# Altium footprint library TinyShuffle v.0.PcbLib: 31 footprints (part 1 of 2)
Each footprint in its own frame and in the unit in brackets; x right, y up, seen from the top. Pads: shape width x height; smd on the part's side, far side on the other; paste and mask are expansions set on the pad; w line width, h text height; cw(c..) or ccw(c..) is an arc to the next point about the centre after c.
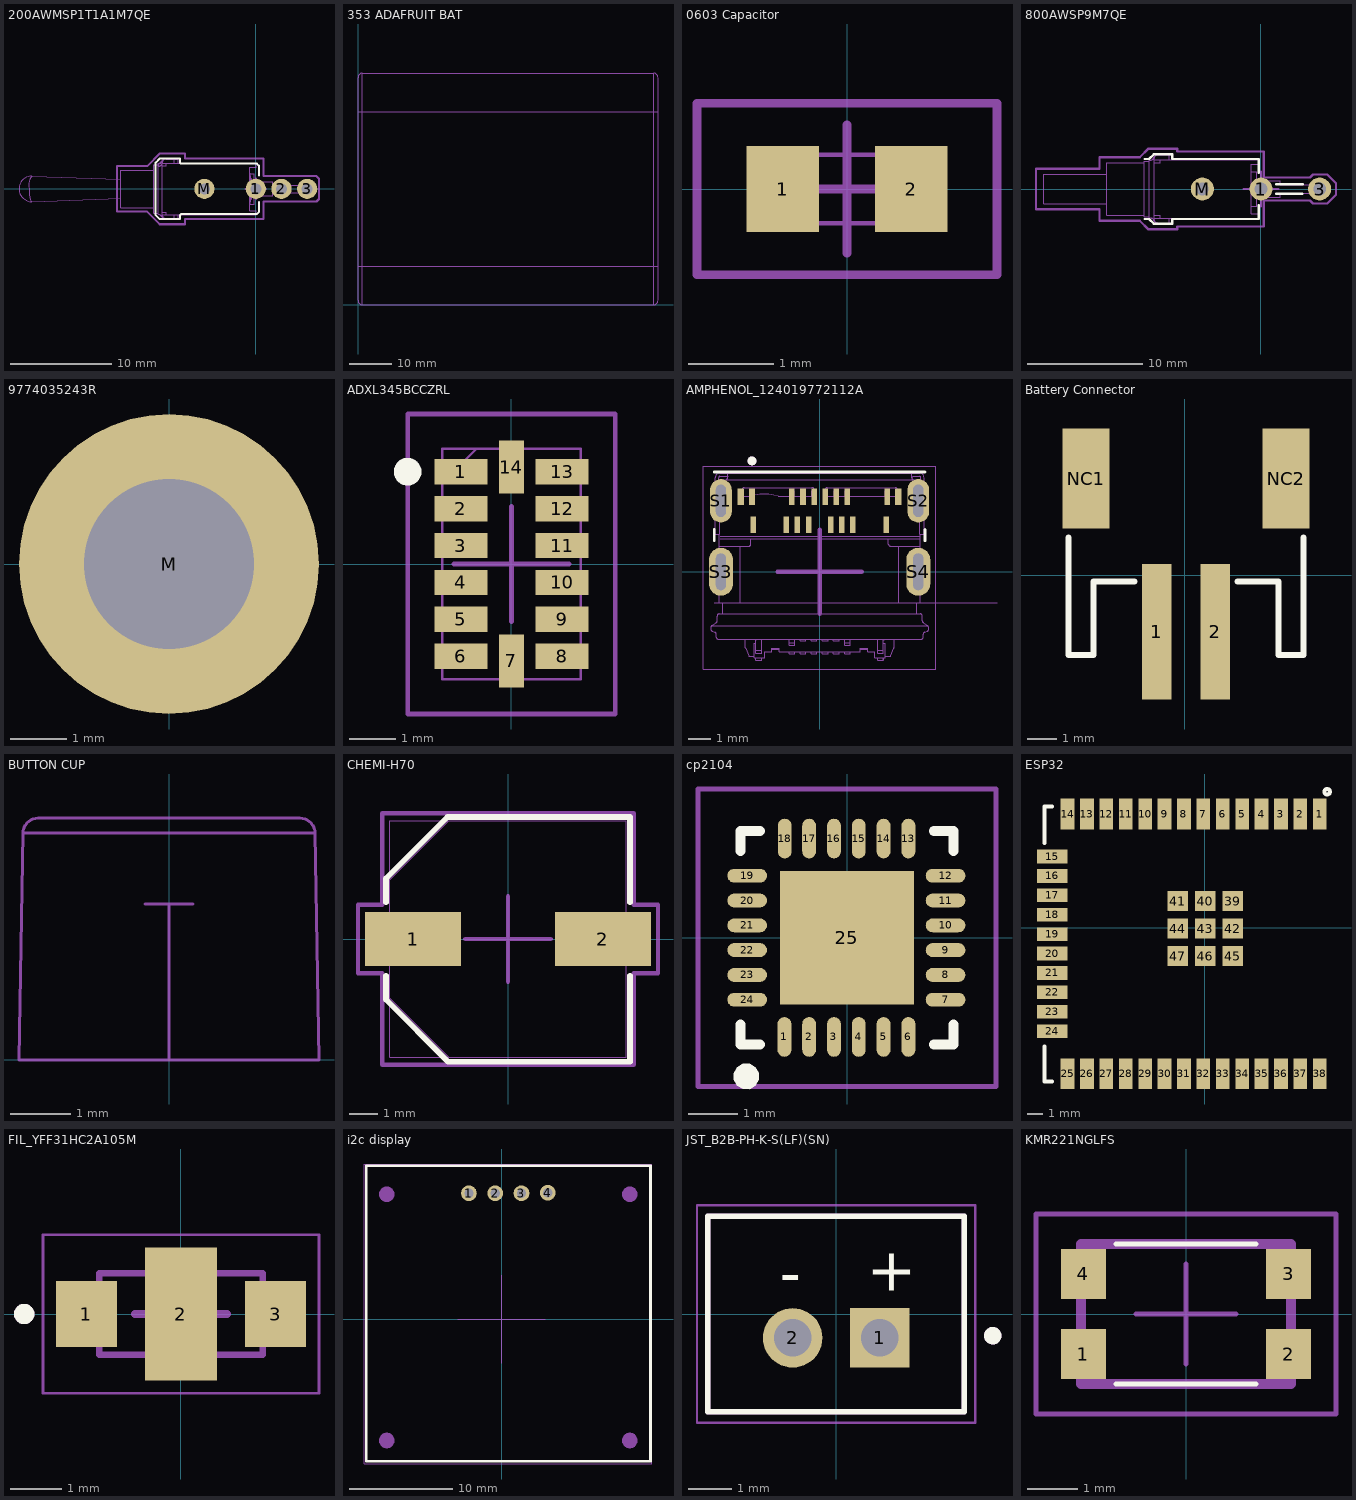
[diagram p0: the footprints below, top view; thin cyan lines are the x and y axes]

## 200AWMSP1T1A1M7QE [mm] "SWITCH TOGGLE SPDT 3A 120V"
height 8.64
pads (4):
  round 2 hole 1.09: 1(0,0) 2(2.54,0) 3(5.08,0) M(-5.08,0)
Top Overlay:
  lines w0.2: 0.3,-1.3 0.3,-2.3 0.1,-2.5 -7.4,-2.5 -7.5,-2.6 -7.5,-3 -9.5,-3 -9.9,-2.6 -9.9,0 -9.9,2.6 -9.5,3 -7.5,3 -7.5,2.6 -7.4,2.5 0.1,2.5 0.3,2.3 0.3,1.3
Top Component Outline:
  drawing of 1308 lines, arcs and shapes, not listed
Top Courtyard (Mech15):
  lines w0.2: -1,0 0,0 ; 0,-1 0,0 ; 0,1 0,0 ; 1,0 0,0 ; -13.75,-2.25 -10.75,-2.25 -9.5,-3.5 -7,-3.5 -7,-3 0.75,-3 0.75,-1.25 6,-1.25 6.25,-1 6.25,0 6.25,1 6,1.25 0.75,1.25 0.75,3 -7,3 -7,3.5 -9.5,3.5 -10.75,2.25 -13.75,2.25 -13.75,0 -13.75,-2.25
3D body "200AWMSPxT1A1M7xE.STEP": height 8.67, standoff -3.27, extent -23.418,-2.95 5.34,2.95

## 353 ADAFRUIT BAT [mm] "18650 1S3P BATTERY PACK 18X70X54"
height 18
Top Component Outline:
  lines w0.1: 0,9 70,9 ; 0,45 70,45 ; 1,0 cw(c1,1) 0,1 0,53 cw(c1,53) 1,54 ; 1,0 1,54 ; 1,0 69,0 ; 1,54 69,54 ; 69,0 ccw(c69,1) 70,1 70,53 ccw(c69,53) 69,54 ; 69,0 69,54
3D body "353 6600mAh Battery.STEP": height 20, standoff 2, extent 0,0.004 70,53.996

## 0603 Capacitor [mm]
pads (2):
  rect 0.85x1 smd: 1(-0.75,0) 2(0.75,0)
Top Component Outline:
  lines w0.05: -0.8,-0.4 -0.8,0.4 0.8,0.4 0.8,-0.4 -0.8,-0.4
Top Courtyard (Mech15):
  lines w0.1: -0.75,0 0,0 ; 0,-0.75 0,0 ; 0,0.75 0,0 ; 0.75,0 0,0 ; -1.75,-1 0,-1 1.75,-1 1.75,0 1.75,1 0,1 -1.75,1 -1.75,0 -1.75,-1
3D body "Ceramic_Capacitor_0603_h32mil.step": height 0.81, standoff 0.01, extent -0.8,-0.4 0.8,0.4

## 800AWSP9M7QE [mm] "SWITCH PUSH SPST-NO 1A 120V"
height 8.74
pads (3):
  round 2 hole 1.09: 1(0,0) 3(5.08,0) M(-5.08,0)
Top Overlay:
  lines w0.2: -10.1,-2.6 -9.7,-2.6 -9.3,-3 -7.7,-3 -7.7,-2.6 -0.2,-2.6 -0.2,-1.4 ; -10.1,2.6 -9.7,2.6 -9.3,3 -7.7,3 -7.7,2.6 -0.2,2.6 -0.2,1.4 ; 1.3,-0.4 3.6,-0.4 ; 1.3,0.4 3.625,0.4
Top Component Outline:
  drawing of 773 lines, arcs and shapes, not listed
Top Courtyard (Mech15):
  lines w0.2: -1.5,0 0,0 ; 0,-1.5 0,0 ; 0,1.5 0,0 ; 1.5,0 0,0 ; -19.5,-1.75 -14,-1.75 -14,-2.75 -10.5,-2.75 -9.75,-3.5 -8.75,-3.5 -7.25,-3.5 -7.25,-3.25 0.25,-3.25 0.25,-1 4.25,-1 4.5,-1.25 5.75,-1.25 6.5,-0.5 6.5,0 6.5,0.5 5.75,1.25 4.5,1.25 4.25,1 0.25,1 0.25,3.25 -7.25,3.25 -7.25,3.5 -8.75,3.5 -9.75,3.5 -10.5,2.75 -14,2.75 -14,1.75 -19.5,1.75 -19.5,0 -19.5,-1.75
3D body "800AWSP9M7xE.STEP": height 8.74, standoff -3.29, extent -18.83,-2.95 5.34,2.95

## 9774035243R [mm] "RND STANDOFF M2X0.4 STEEL 3.5MM"
height 3.5
pads (1):
  round 5.3 / inner round 5.3 / far side round 0 hole 3 unplated: M(0,0)
Top Component Outline:
  circle w0.1: c0,0 r2.175
  circle w0.1: c0,0 r1.925
  circle w0.1: c0,0 r1.034
  circle w0.1: c0,0 r0.784
Top Courtyard (Mech15):
  circle w0.1: c0,0 r2.5
  lines w0.1: -1.5,0 0,0 ; 0,-1.5 0,0 ; 0,1.5 0,0 ; 1.5,0 0,0
3D body "9774035243R (rev1).STEP": height 3.5, standoff -1.4, extent -2.175,-2.175 2.175,2.175

## ADXL345BCCZRL [mm]
pads (14):
  rect 1.145x0.55 smd mask+0.05: 1(-1.097,2) 2(-1.097,1.2) 3(-1.097,0.4) 4(-1.097,-0.4) 5(-1.097,-1.2) 6(-1.097,-2) 8(1.097,-2) 9(1.097,-1.2) 10(1.097,-0.4) 11(1.097,0.4) 12(1.097,1.2) 13(1.097,2)
  rect 0.55x1.145 smd mask+0.05: 7(0,-2.098) 14(0,2.098)
Top Overlay:
  circle w0.3: c-2.25,2 r0.15
Top Component Outline:
  lines w0.05: -1.5,1.75 -0.75,2.5 ; -0.75,2.5 -0.75,2.5 ; -1.5,-2.5 1.5,-2.5 1.5,2.5 -1.5,2.5 -1.5,-2.5
Top Courtyard (Mech15):
  lines w0.1: -1.25,0 0,0 ; 0,-1.25 0,0 ; 0,1.25 0,0 ; 1.25,0 0,0 ; -2.25,-3.25 -2.25,0 -2.25,3.25 0,3.25 2.25,3.25 2.25,0 2.25,-3.25 0,-3.25 -2.25,-3.25
3D body "ADXL345BCCZ-RL.stp": height 1.1, standoff 0, extent -1.5,-2.5 1.5,2.5

## AMPHENOL_124019772112A [mm]
pads (22):
  rect 0.25x0.75 smd: A1(-3.05,3.375) A4(-1.25,3.375) A5(-0.75,3.375) A6(-0.25,3.375) A7(0.25,3.375) A8(0.75,3.375) A9(1.25,3.375) A12(3.05,3.375) B1(3,2.125) B4(1.5,2.125) B5(1,2.125) B6(0.5,2.125) B7(-0.5,2.125) B8(-1,2.125) B9(-1.5,2.125) B12(-3,2.125)
  rect 0.3x0.75 smd: G1(-3.55,3.375) G2(3.55,3.375)
  oval 0.98x1.96 hole 0.45 slot 1.45 at 90 deg: S1(-4.45,3.2) S2(4.45,3.2)
  oval 1.08x2.16 hole 0.45 slot 1.65 at 90 deg: S3(-4.45,0) S4(4.45,0)
Top Overlay:
  circle w0.2: c-3.05,5 r0.1
  lines w0.127: -4.75,1.4 -4.75,1.9 ; -4.75,4.5 4.75,4.5 ; 4.75,1.4 4.75,1.9
Top Component Outline:
  drawing of 2284 lines, arcs and shapes, not listed
  text "PCB EDGE" at 5.4,-1.2 h0.61
Top Courtyard (Mech15):
  lines w0.05: -5.24,-4.4 -5.24,4.75 5.24,4.75 5.24,-4.4 -5.24,-4.4
  lines w0.2: -1.9,0 0,0 ; 0,-1.9 0,0 ; 0,1.9 0,0 ; 1.9,0 0,0
3D body "124019772112A--3DModel-STEP-533217.STEP": height 3.53, standoff -0.53, extent -4.92,-4.2 4.93,4.45

## Battery Connector [mm]
pads (4):
  rect 1x4.6 smd: 1(-0.965,-1.922) 2(1.035,-1.922)
  rect 1.6x3.4 smd: NC1(-3.365,3.278) NC2(3.435,3.278)
Top Overlay:
  lines w0.203: -3.965,1.278 -3.965,-2.722 -3.115,-2.722 -3.115,-0.222 -1.715,-0.222 ; 1.785,-0.222 3.185,-0.222 3.185,-2.722 4.035,-2.722 4.035,1.278

## BUTTON CUP [mm] "800AC1BLKCAP"
height 5
Top Component Outline:
  lines w0.05: -0.4,2.6 0,2.6 ; 0.4,2.6 0,2.6 ; -2.5,0 0,0 0,2.6 ; -2.5,0 -2.434,3.784 ; -2.5,0 2.5,0 2.434,3.784 ; -2.434,3.784 cw(c-2.184,3.78) -2.184,4.03 2.184,4.03 cw(c2.184,3.78) 2.434,3.784 ; -2.434,3.784 2.434,3.784
3D body "800AC1BLKCAP.STEP": height 7.18, standoff 2.18, extent -2.5,0 2.5,4.03

## CHEMI-H70 [mil]
pads (2):
  rect 132x75 smd: 1(-131,0) 2(131,0)
Top Overlay:
  lines w7.99: -168.5,-50.6 -168.5,-83.47 -82.68,-169.29 168.5,-169.29 168.5,-50.6 ; -168.5,50.6 -168.5,83.47 -83.47,168.5 168.5,168.5 168.5,50.6
Top Component Outline:
  lines w1: -163.5,-81.75 -81.75,-163.5 ; -163.5,81.75 -81.75,163.5 ; -163.5,-163.5 163.5,-163.5 163.5,163.5 -163.5,163.5 -163.5,-163.5
Top Courtyard (Mech15):
  lines w5.98: -59.06,0 0,0 ; 0,-59.06 0,0 ; 0,59.06 0,0 ; 59.06,0 0,0
  lines w6: -207,-47.5 -207,47.5 -173.5,47.5 -173.5,173.5 173.5,173.5 173.5,47.5 207,47.5 207,-47.5 173.5,-47.5 173.5,-173.5 -173.5,-173.5 -173.5,-47.5 -207,-47.5
3D body "CHEMI-H70.step": height 266.1, standoff 0, extent -177.17,-167.32 176.85,159.69

## cp2104 [mm]
pads (25):
  oval 0.28x0.8 smd mask+0.05: 1(-1.263,-1.999) 2(-0.763,-1.999) 3(-0.263,-1.999) 4(0.237,-1.999) 5(0.737,-1.999) 6(1.237,-1.999) 13(1.237,2.001) 14(0.737,2.001) 15(0.237,2.001) 16(-0.263,2.001) 17(-0.763,2.001) 18(-1.255,2.001)
  oval 0.8x0.28 smd mask+0.05: 7(1.987,-1.248) 8(1.987,-0.749) 9(1.987,-0.248) 10(1.987,0.251) 11(1.987,0.752) 12(1.987,1.251) 19(-2.013,1.251) 20(-2.013,0.752) 21(-2.013,0.251) 22(-2.013,-0.248) 23(-2.013,-0.749) 24(-2.013,-1.248)
  rect 2.7x2.7 smd mask+0.05: 25(0,0.001)
Top Overlay:
  region: -1.777,-2.793 -1.778,-2.725 -1.846,-2.607 -1.964,-2.54 -2.1,-2.54 -2.218,-2.608 -2.285,-2.726 -2.285,-2.862 -2.218,-2.98 -2.1,-3.048 -1.964,-3.048 -1.846,-2.981 -1.778,-2.863 -1.777,-2.795
  lines w0.2: -2.151,-1.749 -2.151,-2.149 -1.751,-2.149 ; -2.151,1.751 -2.151,2.151 -1.751,2.151 ; 1.75,-2.149 2.15,-2.149 2.15,-1.749 ; 1.75,2.151 2.15,2.151 2.15,1.751
Top Courtyard (Mech15):
  lines w0.1: -1,0 0,0 ; 0,-1 0,0 ; 0,1 0,0 ; 1,0 0,0 ; -3,-3 0,-3 3,-3 3,3 -3,3 -3,-3
3D body "QFN_F03-GMR_SIL.step": height 0.81, standoff 0, extent -1.994,-1.994 1.994,1.994

## ESP32 [mm]
pads (47):
  rect 0.9x2 smd: 1(7.513,7.433) 2(6.243,7.433) 3(4.973,7.433) 4(3.703,7.433) 5(2.433,7.433) 6(1.163,7.433) 7(-0.107,7.433) 8(-1.377,7.433) 9(-2.647,7.433) 10(-3.917,7.433) 11(-5.187,7.433) 12(-6.457,7.433) 13(-7.727,7.433) 14(-8.997,7.433) 25(-8.997,-9.567) 26(-7.727,-9.567) 27(-6.457,-9.567) 28(-5.187,-9.567) 29(-3.917,-9.567) 30(-2.647,-9.567) 31(-1.377,-9.567) 32(-0.107,-9.567) 33(1.163,-9.567) 34(2.433,-9.567) 35(3.703,-9.567) 36(4.973,-9.567) 37(6.243,-9.567) 38(7.513,-9.567)
  rect 2x0.9 smd: 15(-9.997,4.648) 16(-9.997,3.378) 17(-9.997,2.108) 18(-9.997,0.838) 19(-9.997,-0.432) 20(-9.997,-1.702) 21(-9.997,-2.972) 22(-9.997,-4.242) 23(-9.997,-5.512) 24(-9.997,-6.782)
  rect 1.33x1.33 smd: 39(1.813,1.733) 40(0.013,1.733) 41(-1.787,1.733) 42(1.813,-0.067) 43(0.013,-0.067) 44(-1.787,-0.067) 45(1.813,-1.867) 46(0.013,-1.867) 47(-1.787,-1.867)
Top Overlay:
  circle w0.254: c8.001,8.89 r0.18
  lines w0.254: -10.497,-7.767 -10.497,-10.067 -9.997,-10.067 ; -10.497,5.533 -10.497,7.933 -9.997,7.933
3D body "User Library-ESP321.step": height -0.41, standoff -3.32, extent -10.461,-10.121 15.039,7.879

## FIL_YFF31HC2A105M [mm]
pads (3):
  rect 1.2x1.3 smd: 1(-1.85,0) 3(1.85,0)
  rect 1.4x2.6 smd paste-2 mask+0: 2(0,0)
Top Overlay:
  circle w0.2: c-3.069,0 r0.1
Top Paste:
  region: 0.7,0.4 -0.7,0.4 -0.7,1.3 0.7,1.3
  region: 0.7,-1.3 -0.7,-1.3 -0.7,-0.4 0.7,-0.4
Top Solder:
  region: 0.8,0.4 -0.8,0.4 -0.8,1.4 0.8,1.4
  region: 0.8,-1.4 -0.8,-1.4 -0.8,-0.4 0.8,-0.4
Top Component Outline:
  circle w0.2: c-3.069,0 r0.1
  lines w0.127: -1.6,-0.8 -1.6,0.8 1.6,0.8 1.6,-0.8 -1.6,-0.8
Top Courtyard (Mech15):
  lines w0.05: -2.7,-1.55 -2.7,1.55 2.7,1.55 2.7,-1.55 -2.7,-1.55
  lines w0.152: -0.9,0 0,0 ; 0,-0.9 0,0 ; 0,0.9 0,0 ; 0.9,0 0,0
3D body "Part1.STEP": height 1.3, standoff 0, extent -1.6,-0.8 1.6,0.8

## i2c display [mil]
pads (8):
  round 60 hole 35: 1(-124.21,479.01) 2(-24.21,479.01) 3(75.79,479.01) 4(175.79,481.14)
  round 60 on Mech13: ""(-436.81,-461.93) ""(-436.81,475.07) ""(488.39,-461.93) ""(488.39,475.07)
Top Overlay:
  lines w10: -515.55,-540.67 567.13,-540.67 567.13,583.34 -515.55,583.34 -515.55,-540.67
Top Courtyard (Mech15):
  lines w3.94: -167.32,0 0,0 ; 0,-167.32 0,0 ; 0,167.32 0,0 ; 167.32,0 0,0 ; -521.65,-551.18 0,-551.18 570.87,-551.18 570.87,590.55 -521.65,590.55 -521.65,-551.18
3D body "I2COLEDDisplayAdafruit.step": height 249.72, standoff -98.23, extent -499.82,-523.35 551.37,573.5

## JST_B2B-PH-K-S(LF)(SN) [mm]
pads (2):
  rect 1.368x1.368 hole 0.86: 1(1,-0.55)
  round 1.368 hole 0.86: 2(-1,-0.55)
Top Overlay:
  circle w0.2: c3.6,-0.5 r0.1
  lines w0.127: -2.95,-2.25 -2.95,2.25 2.95,2.25 2.95,-2.25 -2.95,-2.25
  text "-" at -1.3,0.45 h1
  text "+" at 0.7,0.533 h1
Top Component Outline:
  circle w0.2: c3.6,-0.5 r0.1
  lines w0.127: -2.95,-2.25 2.95,-2.25 2.95,2.25 -2.95,2.25 -2.95,-2.25
Top Courtyard (Mech15):
  lines w0.05: -3.2,-2.5 3.2,-2.5 3.2,2.5 -3.2,2.5 -3.2,-2.5
3D body "B2B-PH-K-S(LF)(SN)--3DModel-STEP-56544.STEP": height 6.01, standoff -3.39, extent -2.95,-2.25 2.95,2.25

## KMR221NGLFS [mm]
pads (4):
  rect 0.9x1 smd: 1(-2.05,-0.8) 2(2.05,-0.8) 3(2.05,0.8) 4(-2.05,0.8)
Top Overlay:
  lines w0.1: -1.4,-1.4 1.4,-1.4 ; -1.4,1.4 1.4,1.4
Top Component Outline:
  lines w0.2: -2.1,-1.4 -2.1,1.4 2.1,1.4 2.1,-1.4 -2.1,-1.4
Top Courtyard (Mech15):
  lines w0.1: -1,0 0,0 ; 0,-1 0,0 ; 0,1 0,0 ; 1,0 0,0 ; -3,-2 -3,2 3,2 3,-2 -3,-2
3D body "User Library-Switch-CK-KMR2.STEP": height 2.1, standoff 0, extent -2.35,-1.478 2.25,1.522